# Altium footprint library 6-Connectors-3.PcbLib: 153 footprints (part 8 of 11) (continued)
## TYCO_1-770182-0 [mm] "9 Circuits Vertiacal Mini-Universal MATE-N-LOK Connector"
height 14.25
pads (10):
  round 2.1 hole 1.4: 1(4.14,4.14) 2(0,4.14) 3(-4.14,4.14) 4(4.14,0) 5(0,0) 6(-4.14,0) 7(4.14,-4.14) 8(0,-4.14) 9(-4.14,-4.14)
  round 1 hole 3.2 unplated mask+1.2: 10(8.59,4.14)
Top Overlay:
  lines w0.2: -6.985,-5.41 -9.576,-5.41 -9.576,-2.87 -6.985,-2.87 ; -5.842,-6.985 -5.842,-7.747 -6.985,-7.747 -6.985,-6.985 ; -2.845,-6.985 -2.845,-7.747 -1.702,-7.747 -1.702,-6.985 ; -1.499,6.985 -1.499,8.28 1.499,8.28 1.499,6.985 ; 1.295,-6.985 1.295,-7.747 2.438,-7.747 2.438,-6.985 ; 5.436,-6.985 5.436,-7.747 6.579,-7.747 6.579,-6.985 ; 6.985,3 6.985,-6.985 -6.985,-6.985 ; 6.985,5.3 6.985,6.985 -6.985,6.985 -6.985,-6.985 ; 7.561,2.646 7.561,2.353 ccw(c8.298,4.178) 9.267,2.465 ; 7.561,5.71 7.561,6.004 cw(c8.298,4.178) 9.492,5.743 ; -5.969,-5.969 -5.969,-2.311 -2.311,-2.311 -2.311,-5.969 -5.969,-5.969 ; -5.969,-1.829 -5.969,1.829 -2.311,1.829 -2.311,-1.829 -5.969,-1.829 ; -5.969,2.311 -5.969,5.969 -2.311,5.969 -2.311,2.311 -5.969,2.311 ; -1.829,-5.969 1.829,-5.969 1.829,-3.299 0.841,-2.311 -0.841,-2.311 -1.829,-3.299 -1.829,-5.969 ; -1.829,-1.829 -1.829,1.829 1.829,1.829 1.829,-1.829 -1.829,-1.829 ; -1.829,3.299 -0.841,2.311 0.841,2.311 1.829,3.299 1.829,5.969 -1.829,5.969 -1.829,3.299 ; 2.311,-5.969 2.311,-2.311 5.969,-2.311 5.969,-5.969 2.311,-5.969 ; 2.311,-0.841 3.299,-1.829 5.969,-1.829 5.969,1.829 3.299,1.829 2.311,0.841 2.311,-0.841 ; 2.311,2.311 2.311,5.969 5.969,5.969 5.969,2.311 2.311,2.311
  text "6" at -7.982,-0.505 h1.02
  text "4" at 7.318,-0.605 h1.02
  text "9" at -3.575,-7.882 h1.02
  text "8" at 0.565,-7.882 h1.02
  text "7" at 4.705,-7.882 h1.02
  text "3" at -3.715,7.355 h1.02
  text "1" at 4.64,7.555 h1.02
  text "2" at 0.576,7.261 h1.02
Mechanical 8:
  lines w0.1: -5.14,-4.14 -4.14,-4.14 ; -5.14,0 -4.14,0 ; -5.14,4.14 -4.14,4.14 ; -4.14,-5.14 -4.14,-4.14 ; -4.14,-3.14 -4.14,-4.14 ; -4.14,-1 -4.14,0 ; -4.14,1 -4.14,0 ; -4.14,3.14 -4.14,4.14 ; -4.14,5.14 -4.14,4.14 ; -3.14,-4.14 -4.14,-4.14 ; -3.14,0 -4.14,0 ; -3.14,4.14 -4.14,4.14 ; -1,-4.14 0,-4.14 ; -1,4.14 0,4.14 ; 0,-5.14 0,-4.14 ; 0,-3.14 0,-4.14 ; 0,3.14 0,4.14 ; 0,5.14 0,4.14 ; 1,-4.14 0,-4.14 ; 1,4.14 0,4.14 ; 3.14,-4.14 4.14,-4.14 ; 3.14,0 4.14,0 ; 3.14,4.14 4.14,4.14 ; 4.14,-5.14 4.14,-4.14 ; 4.14,-3.14 4.14,-4.14 ; 4.14,-1 4.14,0 ; 4.14,1 4.14,0 ; 4.14,3.14 4.14,4.14 ; 4.14,5.14 4.14,4.14 ; 5.14,-4.14 4.14,-4.14 ; 5.14,0 4.14,0 ; 5.14,4.14 4.14,4.14 ; 7.59,4.14 8.59,4.14 ; 8.59,3.14 8.59,4.14 ; 8.59,5.14 8.59,4.14 ; 9.59,4.14 8.59,4.14 ; 0,0 -1,0 0,0 ; 0,0 1,0 0,0 ; 0,0 0,1 0,0 ; 0,0 0,-1 0,0
Mechanical 14:
  drawing of 162 lines, arcs and shapes, not listed
  text "6" at -7.982,-0.505 h1.02
  text "4" at 7.318,-0.605 h1.02
  text "9" at -3.575,-7.882 h1.02
  text "8" at 0.565,-7.882 h1.02
  text "7" at 4.705,-7.882 h1.02
  text "3" at -3.715,7.355 h1.02
  text "1" at 4.64,7.555 h1.02
  text "2" at 0.576,7.261 h1.02
3D body "TYCO_1-770182-0.stp": height 14.25, standoff -4.32, extent -9.576,-7.747 9.576,8.28

## TYCO_1-794065-0 [mm] "8 Circuits Double Row Vertiacal Mini-Universal MATE-N-LOK Connector"
height 14.25
pads (9):
  round 2.1 hole 1.4: 1(6.21,2.07) 2(2.07,2.07) 3(-2.07,2.07) 4(-6.21,2.07) 5(6.21,-2.07) 6(2.07,-2.07) 7(-2.07,-2.07) 8(-6.21,-2.07)
  round 1 hole 3.2 unplated mask+1.2: 9(10.655,2.07)
Top Overlay:
  lines w0.2: -9.055,-4.915 9.055,-4.915 9.055,1 ; -9.055,-3.34 -11.645,-3.34 -11.645,-0.8 -9.055,-0.8 ; -7.912,-4.915 -7.912,-5.677 -9.055,-5.677 -9.055,4.915 9.055,4.915 9.055,3.2 ; -4.915,-4.915 -4.915,-5.677 -3.772,-5.677 -3.772,-4.915 ; -1.499,4.915 -1.499,6.21 1.499,6.21 1.499,4.915 ; -0.775,-4.915 -0.775,-5.677 0.368,-5.677 0.368,-4.915 ; 3.365,-4.915 3.365,-5.677 4.508,-5.677 4.508,-4.915 ; 7.505,-4.915 7.505,-5.677 8.648,-5.677 8.648,-4.915 ; 9.69,0.234 9.69,0.527 ; 9.69,0.255 ccw(c10.452,2.07) 11.62,0.486 ; 9.69,3.592 9.69,3.885 cw(c10.452,2.07) 11.62,3.654 ; -7.988,-3.848 -4.432,-3.848 -4.432,-0.292 -7.988,-0.292 -7.988,-3.848 ; -7.988,1.384 -6.896,0.292 -4.432,0.292 -4.432,3.848 -6.896,3.848 -7.988,2.756 -7.988,1.384 ; -3.848,-3.848 -0.292,-3.848 -0.292,-0.292 -3.848,-0.292 -3.848,-3.848 ; -3.848,0.292 -3.848,3.848 -0.292,3.848 -0.292,0.292 -3.848,0.292 ; 0.292,-3.848 0.292,-0.292 3.848,-0.292 3.848,-3.848 0.292,-3.848 ; 0.292,0.292 0.292,3.848 3.848,3.848 3.848,0.292 0.292,0.292 ; 4.432,-3.848 7.988,-3.848 7.988,-0.292 4.432,-0.292 4.432,-3.848 ; 4.432,0.292 6.896,0.292 7.988,1.384 7.988,2.756 6.896,3.848 4.432,3.848 4.432,0.292
  text "1" at 6.765,5.43 h1.02
  text "2" at 3.125,5.28 h1.02
  text "3" at -1.99,5.23 h1.02
  text "4" at -5.655,5.23 h1.02
  text "5" at 6.73,-5.907 h1.02
  text "6" at 2.59,-5.907 h1.02
  text "7" at -1.55,-5.907 h1.02
  text "8" at -5.69,-5.907 h1.02
Mechanical 8:
  lines w0.1: -7.21,-2.07 -6.21,-2.07 ; -7.21,2.07 -6.21,2.07 ; -6.21,-3.07 -6.21,-2.07 ; -6.21,-1.07 -6.21,-2.07 ; -6.21,1.07 -6.21,2.07 ; -6.21,3.07 -6.21,2.07 ; -5.21,-2.07 -6.21,-2.07 ; -5.21,2.07 -6.21,2.07 ; -3.07,-2.07 -2.07,-2.07 ; -3.07,2.07 -2.07,2.07 ; -2.07,-3.07 -2.07,-2.07 ; -2.07,-1.07 -2.07,-2.07 ; -2.07,1.07 -2.07,2.07 ; -2.07,3.07 -2.07,2.07 ; -1.07,-2.07 -2.07,-2.07 ; -1.07,2.07 -2.07,2.07 ; -1,0 0,0 ; 0,-1 0,0 ; 0,1 0,0 ; 1,0 0,0 ; 1.07,-2.07 2.07,-2.07 ; 1.07,2.07 2.07,2.07 ; 2.07,-3.07 2.07,-2.07 ; 2.07,-1.07 2.07,-2.07 ; 2.07,1.07 2.07,2.07 ; 2.07,3.07 2.07,2.07 ; 3.07,-2.07 2.07,-2.07 ; 3.07,2.07 2.07,2.07 ; 5.21,-2.07 6.21,-2.07 ; 5.21,2.07 6.21,2.07 ; 6.21,-3.07 6.21,-2.07 ; 6.21,-1.07 6.21,-2.07 ; 6.21,1.07 6.21,2.07 ; 6.21,3.07 6.21,2.07 ; 7.21,-2.07 6.21,-2.07 ; 7.21,2.07 6.21,2.07 ; 9.655,2.07 10.655,2.07 ; 10.655,1.07 10.655,2.07 ; 10.655,3.07 10.655,2.07 ; 11.655,2.07 10.655,2.07
Mechanical 14:
  drawing of 172 lines, arcs and shapes, not listed
  text "1" at 6.765,5.43 h1.02
  text "2" at 3.125,5.28 h1.02
  text "3" at -1.99,5.23 h1.02
  text "4" at -5.655,5.23 h1.02
  text "5" at 6.73,-5.907 h1.02
  text "6" at 2.59,-5.907 h1.02
  text "7" at -1.55,-5.907 h1.02
  text "8" at -5.69,-5.907 h1.02
3D body "TYCO_1-794065-0.stp": height 14.25, standoff -4.06, extent -11.645,-5.677 11.62,6.21

## TYCO_1-794068-0 [mm] "16 Circuits Double Row Vertiacal Mini-Universal MATE-N-LOK Connector"
height 14.25
pads (18):
  round 2.1 hole 1.4: 1(14.491,1.816) 2(10.351,1.816) 3(6.21,1.816) 4(2.07,1.816) 5(-2.07,1.816) 6(-6.21,1.816) 7(-10.351,1.816) 8(-14.491,1.816) 9(14.491,-2.324) 10(10.351,-2.324) 11(6.21,-2.324) 12(2.07,-2.324) 13(-2.07,-2.324) 14(-6.21,-2.324) 15(-10.351,-2.324) 16(-14.491,-2.324)
  round 1 hole 3.2 unplated mask+1.2: 17(18.941,1.816) 18(-18.941,1.816)
Top Overlay:
  lines w0.2: -19.926,0.251 ccw(c-18.733,1.816) -17.996,-0.009 -17.996,0.284 ; -19.926,3.381 cw(c-18.733,1.816) -17.996,3.642 -17.996,3.348 ; -16.193,-5.169 -16.193,-5.931 -17.336,-5.931 -17.336,-5.169 ; -15.31,-5.169 -17.336,-5.169 ; -13.31,-5.169 17.336,-5.169 17.336,4.661 -17.336,4.661 -17.336,-5.169 ; -13.195,-5.169 -13.195,-5.931 -12.052,-5.931 -12.052,-5.169 ; -9.055,-5.169 -9.055,-5.931 -7.912,-5.931 -7.912,-5.169 ; -4.915,-5.169 -4.915,-5.931 -3.772,-5.931 -3.772,-5.169 ; -1.499,4.661 -1.499,5.956 1.499,5.956 1.499,4.661 ; -0.775,-5.169 -0.775,-5.931 0.368,-5.931 0.368,-5.169 ; 3.366,-5.169 3.366,-5.931 4.509,-5.931 4.509,-5.169 ; 7.506,-5.169 7.506,-5.931 8.649,-5.931 8.649,-5.169 ; 11.646,-5.169 11.646,-5.931 12.789,-5.931 12.789,-5.169 ; 15.786,-5.169 15.786,-5.931 16.929,-5.931 16.929,-5.169 ; 17.996,0.284 17.996,-0.009 ccw(c18.733,1.816) 19.926,0.251 ; 17.996,3.348 17.996,3.642 cw(c18.733,1.816) 19.926,3.381 ; -16.269,-4.102 -12.713,-4.102 -12.713,-1.638 -13.805,-0.546 -15.177,-0.546 -16.269,-1.638 -16.269,-4.102 ; -16.269,0.038 -16.269,3.594 -12.713,3.594 -12.713,0.038 -16.269,0.038 ; -12.129,-4.102 -12.129,-0.546 -8.573,-0.546 -8.573,-4.102 -12.129,-4.102 ; -12.129,0.038 -12.129,3.594 -8.573,3.594 -8.573,0.038 -12.129,0.038 ; -7.988,-4.102 -4.432,-4.102 -4.432,-1.638 -5.525,-0.546 -6.896,-0.546 -7.988,-1.638 -7.988,-4.102 ; -7.988,0.038 -4.432,0.038 -4.432,2.502 -5.525,3.594 -6.896,3.594 -7.988,2.502 -7.988,0.038 ; -3.848,-4.102 -3.848,-0.546 -0.292,-0.546 -0.292,-4.102 -3.848,-4.102 ; -3.848,0.038 -3.848,3.594 -0.292,3.594 -0.292,0.038 -3.848,0.038 ; 0.292,-4.102 0.292,-0.546 3.848,-0.546 3.848,-4.102 0.292,-4.102 ; 0.292,0.038 0.292,3.594 3.848,3.594 3.848,0.038 0.292,0.038 ; 4.432,-3.01 5.525,-4.102 7.988,-4.102 7.988,-0.546 5.525,-0.546 4.432,-1.638 4.432,-3.01 ; 4.432,1.13 5.525,0.038 7.988,0.038 7.988,3.594 5.525,3.594 4.432,2.502 4.432,1.13 ; 8.573,-4.102 8.573,-0.546 12.129,-0.546 12.129,-4.102 8.573,-4.102 ; 8.573,0.038 8.573,3.594 12.129,3.594 12.129,0.038 8.573,0.038 ; 12.713,-4.102 12.713,-0.546 15.177,-0.546 16.269,-1.638 16.269,-3.01 15.177,-4.102 12.713,-4.102 ; 12.713,0.038 12.713,3.594 16.269,3.594 16.269,0.038 12.713,0.038
  text "1" at 14.893,3.906 h1
  text "16" at -13.92,-5.907 h1
  text "9" at 14.96,-4.891 h1
  text "8" at -14.072,3.745 h1
Mechanical 8:
  lines w0.1: -19.941,1.816 -18.941,1.816 ; -18.941,0.816 -18.941,1.816 ; -18.941,2.816 -18.941,1.816 ; -17.941,1.816 -18.941,1.816 ; -15.491,-2.324 -14.491,-2.324 ; -15.491,1.816 -14.491,1.816 ; -14.491,-3.324 -14.491,-2.324 ; -14.491,-1.324 -14.491,-2.324 ; -14.491,0.816 -14.491,1.816 ; -14.491,2.816 -14.491,1.816 ; -13.491,-2.324 -14.491,-2.324 ; -13.491,1.816 -14.491,1.816 ; -11.351,-2.324 -10.351,-2.324 ; -11.351,1.816 -10.351,1.816 ; -10.351,-3.324 -10.351,-2.324 ; -10.351,-1.324 -10.351,-2.324 ; -10.351,0.816 -10.351,1.816 ; -10.351,2.816 -10.351,1.816 ; -9.351,-2.324 -10.351,-2.324 ; -9.351,1.816 -10.351,1.816 ; -7.21,-2.324 -6.21,-2.324 ; -7.21,1.816 -6.21,1.816 ; -6.21,-3.324 -6.21,-2.324 ; -6.21,-1.324 -6.21,-2.324 ; -6.21,0.816 -6.21,1.816 ; -6.21,2.816 -6.21,1.816 ; -5.21,-2.324 -6.21,-2.324 ; -5.21,1.816 -6.21,1.816 ; -3.07,-2.324 -2.07,-2.324 ; -3.07,1.816 -2.07,1.816 ; -2.07,-3.324 -2.07,-2.324 ; -2.07,-1.324 -2.07,-2.324 ; -2.07,0.816 -2.07,1.816 ; -2.07,2.816 -2.07,1.816 ; -1.07,-2.324 -2.07,-2.324 ; -1.07,1.816 -2.07,1.816 ; -1,0 0,0 ; 0,-1 0,0 ; 0,1 0,0 ; 1,0 0,0 ; 1.07,-2.324 2.07,-2.324 ; 1.07,1.816 2.07,1.816 ; 2.07,-3.324 2.07,-2.324 ; 2.07,-1.324 2.07,-2.324 ; 2.07,0.816 2.07,1.816 ; 2.07,2.816 2.07,1.816 ; 3.07,-2.324 2.07,-2.324 ; 3.07,1.816 2.07,1.816 ; 5.21,-2.324 6.21,-2.324 ; 5.21,1.816 6.21,1.816 ; 6.21,-3.324 6.21,-2.324 ; 6.21,-1.324 6.21,-2.324 ; 6.21,0.816 6.21,1.816 ; 6.21,2.816 6.21,1.816 ; 7.21,-2.324 6.21,-2.324 ; 7.21,1.816 6.21,1.816 ; 9.351,-2.324 10.351,-2.324 ; 9.351,1.816 10.351,1.816 ; 10.351,-3.324 10.351,-2.324 ; 10.351,-1.324 10.351,-2.324 ; 10.351,0.816 10.351,1.816 ; 10.351,2.816 10.351,1.816 ; 11.351,-2.324 10.351,-2.324 ; 11.351,1.816 10.351,1.816 ; 13.491,-2.324 14.491,-2.324 ; 13.491,1.816 14.491,1.816 ; 14.491,-3.324 14.491,-2.324 ; 14.491,-1.324 14.491,-2.324 ; 14.491,0.816 14.491,1.816 ; 14.491,2.816 14.491,1.816 ; 15.491,-2.324 14.491,-2.324 ; 15.491,1.816 14.491,1.816 ; 17.941,1.816 18.941,1.816 ; 18.941,0.816 18.941,1.816 ; 18.941,2.816 18.941,1.816 ; 19.941,1.816 18.941,1.816
Mechanical 14:
  lines w0.1: -19.926,0.991 ccw(c-18.961,1.816) -17.996,0.991 ; -19.926,2.642 cw(c-18.961,1.816) -17.996,2.642 ; -17.336,1.054 -17.996,1.054 -17.996,-0.009 cw(c-18.733,1.816) -19.926,0.251 -19.926,3.381 cw(c-18.733,1.816) -17.996,3.642 -17.996,2.578 -17.336,2.578 ; -16.193,-5.169 -16.193,-5.931 -17.336,-5.931 -17.336,-5.169 ; -15.31,-5.169 -17.336,-5.169 ; -13.31,-5.169 17.336,-5.169 17.336,4.661 -17.336,4.661 -17.336,-5.169 ; -13.195,-5.169 -13.195,-5.931 -12.052,-5.931 -12.052,-5.169 ; -9.055,-5.169 -9.055,-5.931 -7.912,-5.931 -7.912,-5.169 ; -4.915,-5.169 -4.915,-5.931 -3.772,-5.931 -3.772,-5.169 ; -1.499,4.661 -1.499,5.956 1.499,5.956 1.499,4.661 ; -0.775,-5.169 -0.775,-5.931 0.368,-5.931 0.368,-5.169 ; 3.366,-5.169 3.366,-5.931 4.509,-5.931 4.509,-5.169 ; 7.506,-5.169 7.506,-5.931 8.649,-5.931 8.649,-5.169 ; 11.646,-5.169 11.646,-5.931 12.789,-5.931 12.789,-5.169 ; 15.786,-5.169 15.786,-5.931 16.929,-5.931 16.929,-5.169 ; 17.336,1.054 17.996,1.054 17.996,-0.009 ccw(c18.733,1.816) 19.926,0.251 19.926,3.381 ccw(c18.733,1.816) 17.996,3.642 17.996,2.578 17.336,2.578 ; 17.996,0.991 ccw(c18.961,1.816) 19.926,0.991 ; 17.996,2.642 cw(c18.961,1.816) 19.926,2.642 ; -16.269,-4.102 -12.713,-4.102 -12.713,-1.638 -13.805,-0.546 -15.177,-0.546 -16.269,-1.638 -16.269,-4.102 ; -16.269,0.038 -16.269,3.594 -12.713,3.594 -12.713,0.038 -16.269,0.038 ; -12.129,-4.102 -12.129,-0.546 -8.573,-0.546 -8.573,-4.102 -12.129,-4.102 ; -12.129,0.038 -12.129,3.594 -8.573,3.594 -8.573,0.038 -12.129,0.038 ; -7.988,-4.102 -7.988,-1.638 -6.896,-0.546 -5.525,-0.546 -4.432,-1.638 -4.432,-4.102 -7.988,-4.102 ; -7.988,0.038 -7.988,2.502 -6.896,3.594 -5.525,3.594 -4.432,2.502 -4.432,0.038 -7.988,0.038 ; -3.848,-4.102 -3.848,-0.546 -0.292,-0.546 -0.292,-4.102 -3.848,-4.102 ; -3.848,0.038 -3.848,3.594 -0.292,3.594 -0.292,0.038 -3.848,0.038 ; 0.292,-4.102 0.292,-0.546 3.848,-0.546 3.848,-4.102 0.292,-4.102 ; 0.292,0.038 0.292,3.594 3.848,3.594 3.848,0.038 0.292,0.038 ; 4.432,-3.01 5.525,-4.102 7.988,-4.102 7.988,-0.546 5.525,-0.546 4.432,-1.638 4.432,-3.01 ; 4.432,1.13 4.432,2.502 5.525,3.594 7.988,3.594 7.988,0.038 5.525,0.038 4.432,1.13 ; 8.573,-4.102 8.573,-0.546 12.129,-0.546 12.129,-4.102 8.573,-4.102 ; 8.573,0.038 8.573,3.594 12.129,3.594 12.129,0.038 8.573,0.038 ; 12.713,-4.102 12.713,-0.546 15.177,-0.546 16.269,-1.638 16.269,-3.01 15.177,-4.102 12.713,-4.102 ; 12.713,0.038 12.713,3.594 16.269,3.594 16.269,0.038 12.713,0.038
  text "1" at 14.893,3.906 h1
  text "16" at -13.92,-5.907 h1
  text "9" at 14.96,-4.891 h1
  text "8" at -14.072,3.745 h1
3D body "TYCO_1-794068-0.stp": height 14.25, standoff -4.06, extent -19.926,-5.931 19.926,5.956

## TYCO_3-794630-4 [mm] "4 Circuits Dual-Row - Vertical Micro MATE-N-LOK Connector"
height 9.24
pads (4):
  round 1.8 hole 1.1: 1(1.5,-1.5) 2(-1.5,-1.5) 3(1.5,1.5) 4(-1.5,1.5)
Top Overlay:
  lines w0.2: -3.86,-1 -3.43,-1 ; -3.86,1 -3.43,1 ; -1.9,-3.43 cw(c-1.9,-3.63) -1.7,-3.63 -1.7,-3.94 -0.45,-3.94 -0.45,-3.63 cw(c-0.25,-3.63) -0.25,-3.43 ; -1.3,3.43 ccw(c-1.3,4.03) -0.7,4.03 -0.7,4.082 ; 0.25,-3.43 cw(c0.25,-3.63) 0.45,-3.63 0.45,-3.94 1.7,-3.94 1.7,-3.63 cw(c1.9,-3.63) 1.9,-3.43 ; 1.3,3.43 cw(c1.3,4.03) 0.7,4.03 0.7,4.082 ; 3.43,-1 3.86,-1 ; 3.43,1 3.86,1 ; -4.55,-1.5 -3.86,-1.5 -3.86,1.5 -4.55,1.5 ; -4.55,-1.5 -5,-0.72 -5,0.72 -4.55,1.5 ; -4.55,-1.5 -4.55,1.5 ; -0.7,4.082 -0.7,4.73 0.7,4.73 0.7,4.082 ; -0.7,4.082 0.7,4.082 ; 4.55,-1.5 3.86,-1.5 3.86,1.5 4.55,1.5 ; 4.55,-1.5 4.55,1.5 ; 4.55,-1.5 5,-0.72 5,0.72 4.55,1.5 ; -3.43,-3.43 -3.43,3.43 3.43,3.43 3.43,-3.43 -3.43,-3.43 ; -2.81,-2.11 -2.81,-0.19 -0.19,-0.19 -0.19,-2.81 -2.11,-2.81 -2.81,-2.11 ; -2.81,0.19 -0.89,0.19 -0.19,0.89 -0.19,2.81 -2.81,2.81 -2.81,0.19 ; 0.19,-2.81 2.11,-2.81 2.81,-2.11 2.81,-0.19 0.19,-0.19 0.19,-2.81 ; 0.19,0.89 0.19,2.81 2.81,2.81 2.81,0.19 0.89,0.19 0.19,0.89
  text "1" at 3.048,-4.245 h1.02
  text "2" at -2.007,-4.445 h1.02
  text "4" at -1.575,3.734 h1.02
  text "3" at 2.743,3.712 h1.02
Mechanical 8:
  lines w0.1: -2.5,-1.5 -1.5,-1.5 ; -2.5,1.5 -1.5,1.5 ; -1.5,-2.5 -1.5,-1.5 ; -1.5,-0.5 -1.5,-1.5 ; -1.5,0.5 -1.5,1.5 ; -1.5,2.5 -1.5,1.5 ; -1,0 0,0 ; -0.5,-1.5 -1.5,-1.5 ; -0.5,1.5 -1.5,1.5 ; 0,-1 0,0 ; 0,1 0,0 ; 0.5,-1.5 1.5,-1.5 ; 0.5,1.5 1.5,1.5 ; 1,0 0,0 ; 1.5,-2.5 1.5,-1.5 ; 1.5,-0.5 1.5,-1.5 ; 1.5,0.5 1.5,1.5 ; 1.5,2.5 1.5,1.5 ; 2.5,-1.5 1.5,-1.5 ; 2.5,1.5 1.5,1.5
Mechanical 14:
  lines w0.1: -3.86,-1 -3.43,-1 ; -3.86,1 -3.43,1 ; -1.9,-3.43 cw(c-1.9,-3.63) -1.7,-3.63 -1.7,-3.94 -0.45,-3.94 -0.45,-3.63 cw(c-0.25,-3.63) -0.25,-3.43 ; -1.3,3.43 ccw(c-1.3,4.03) -0.7,4.03 -0.7,4.082 ; 0.25,-3.43 cw(c0.25,-3.63) 0.45,-3.63 0.45,-3.94 1.7,-3.94 1.7,-3.63 cw(c1.9,-3.63) 1.9,-3.43 ; 1.3,3.43 cw(c1.3,4.03) 0.7,4.03 0.7,4.082 ; 3.43,-1 3.86,-1 ; 3.43,1 3.86,1 ; -4.55,-1.5 -3.86,-1.5 -3.86,1.5 -4.55,1.5 ; -4.55,-1.5 -5,-0.72 -5,0.72 -4.55,1.5 ; -4.55,-1.5 -4.55,1.5 ; -0.7,4.082 -0.7,4.73 0.7,4.73 0.7,4.082 ; -0.7,4.082 0.7,4.082 ; 4.55,-1.5 3.86,-1.5 3.86,1.5 4.55,1.5 ; 4.55,-1.5 4.55,1.5 ; 4.55,-1.5 5,-0.72 5,0.72 4.55,1.5 ; -3.43,-3.43 -3.43,3.43 3.43,3.43 3.43,-3.43 -3.43,-3.43 ; -2.81,-2.11 -2.81,-0.19 -0.19,-0.19 -0.19,-2.81 -2.11,-2.81 -2.81,-2.11 ; -2.81,0.19 -0.89,0.19 -0.19,0.89 -0.19,2.81 -2.81,2.81 -2.81,0.19 ; 0.19,-2.81 2.11,-2.81 2.81,-2.11 2.81,-0.19 0.19,-0.19 0.19,-2.81 ; 0.19,0.89 0.19,2.81 2.81,2.81 2.81,0.19 0.89,0.19 0.19,0.89
  text "1" at 3.048,-4.245 h1.02
  text "2" at -2.007,-4.445 h1.02
  text "4" at -1.575,3.734 h1.02
  text "3" at 2.743,3.712 h1.02
3D body "TYCO_3-794630-4.stp": height 9.24, standoff -3.18, extent -5,-3.94 5,4.73

## TYCO_3-794630-8 [mm] "8 Circuits Dual-Row - Vertical Micro MATE-N-LOK Connector"
height 9.24
pads (8):
  round 1.8 hole 1.1: 1(4.5,-1.5) 2(1.5,-1.5) 3(-1.5,-1.5) 4(-4.5,-1.5) 5(4.5,1.5) 6(1.5,1.5) 7(-1.5,1.5) 8(-4.5,1.5)
Top Overlay:
  lines w0.2: -6.86,-1 -6.43,-1 ; -6.86,1 -6.43,1 ; -4.25,-3.43 cw(c-4.25,-3.63) -4.05,-3.63 -4.05,-3.94 -2.8,-3.94 -2.8,-3.63 cw(c-2.6,-3.63) -2.6,-3.43 ; -1.3,3.43 ccw(c-1.3,4.03) -0.7,4.03 -0.7,4.082 ; 1.3,3.43 cw(c1.3,4.03) 0.7,4.03 0.7,4.082 ; 2.6,-3.43 cw(c2.6,-3.63) 2.8,-3.63 2.8,-3.94 4.05,-3.94 4.05,-3.63 cw(c4.25,-3.63) 4.25,-3.43 ; 6.43,-1 6.86,-1 ; 6.43,1 6.86,1 ; -7.55,-1.5 -7.55,1.5 ; -7.55,-1.5 -8,-0.72 -8,0.72 -7.55,1.5 ; -7.55,-1.5 -6.86,-1.5 -6.86,1.5 -7.55,1.5 ; -0.7,4.082 0.7,4.082 ; -0.7,4.082 -0.7,4.73 0.7,4.73 0.7,4.082 ; 7.55,-1.5 8,-0.72 8,0.72 7.55,1.5 ; 7.55,-1.5 7.55,1.5 ; 7.55,-1.5 6.86,-1.5 6.86,1.5 7.55,1.5 ; -6.43,-3.43 6.43,-3.43 6.43,3.43 -6.43,3.43 -6.43,-3.43 ; -5.81,-2.81 -5.81,-0.19 -3.19,-0.19 -3.19,-2.11 -3.89,-2.81 -5.81,-2.81 ; -5.81,0.19 -5.81,2.81 -3.19,2.81 -3.19,0.19 -5.81,0.19 ; -2.81,-2.11 -2.11,-2.81 -0.19,-2.81 -0.19,-0.19 -2.81,-0.19 -2.81,-2.11 ; -2.81,0.89 -2.11,0.19 -0.19,0.19 -0.19,2.81 -2.81,2.81 -2.81,0.89 ; 0.19,-2.81 0.19,-0.19 2.81,-0.19 2.81,-2.11 2.11,-2.81 0.19,-2.81 ; 0.19,0.19 0.19,2.81 2.81,2.81 2.81,0.89 2.11,0.19 0.19,0.19 ; 3.19,-2.11 3.89,-2.81 5.81,-2.81 5.81,-0.19 3.19,-0.19 3.19,-2.11 ; 3.19,0.89 3.89,0.19 5.81,0.19 5.81,2.81 3.19,2.81 3.19,0.89
  text "3" at -0.889,-4.445 h1.02
  text "2" at 2.032,-4.445 h1.02
  text "7" at -1.448,3.685 h1.02
  text "6" at 2.362,3.685 h1.02
  text "5" at 4.902,3.739 h1.02
  text "8" at -4.064,3.71 h1.02
  text "4" at -4.445,-4.445 h1.02
  text "1" at 5.588,-4.245 h1.02
Mechanical 8:
  lines w0.1: -5.5,-1.5 -4.5,-1.5 ; -5.5,1.5 -4.5,1.5 ; -4.5,-2.5 -4.5,-1.5 ; -4.5,-0.5 -4.5,-1.5 ; -4.5,0.5 -4.5,1.5 ; -4.5,2.5 -4.5,1.5 ; -3.5,-1.5 -4.5,-1.5 ; -3.5,1.5 -4.5,1.5 ; -2.5,-1.5 -1.5,-1.5 ; -2.5,1.5 -1.5,1.5 ; -1.5,-2.5 -1.5,-1.5 ; -1.5,-0.5 -1.5,-1.5 ; -1.5,0.5 -1.5,1.5 ; -1.5,2.5 -1.5,1.5 ; -1,0 0,0 ; -0.5,-1.5 -1.5,-1.5 ; -0.5,1.5 -1.5,1.5 ; 0,-1 0,0 ; 0,1 0,0 ; 0.5,-1.5 1.5,-1.5 ; 0.5,1.5 1.5,1.5 ; 1,0 0,0 ; 1.5,-2.5 1.5,-1.5 ; 1.5,-0.5 1.5,-1.5 ; 1.5,0.5 1.5,1.5 ; 1.5,2.5 1.5,1.5 ; 2.5,-1.5 1.5,-1.5 ; 2.5,1.5 1.5,1.5 ; 3.5,-1.5 4.5,-1.5 ; 3.5,1.5 4.5,1.5 ; 4.5,-2.5 4.5,-1.5 ; 4.5,-0.5 4.5,-1.5 ; 4.5,0.5 4.5,1.5 ; 4.5,2.5 4.5,1.5 ; 5.5,-1.5 4.5,-1.5 ; 5.5,1.5 4.5,1.5
Mechanical 14:
  lines w0.1: -6.86,-1 -6.43,-1 ; -6.86,1 -6.43,1 ; -4.25,-3.43 cw(c-4.25,-3.63) -4.05,-3.63 -4.05,-3.94 -2.8,-3.94 -2.8,-3.63 cw(c-2.6,-3.63) -2.6,-3.43 ; -1.3,3.43 ccw(c-1.3,4.03) -0.7,4.03 -0.7,4.082 ; 1.3,3.43 cw(c1.3,4.03) 0.7,4.03 0.7,4.082 ; 2.6,-3.43 cw(c2.6,-3.63) 2.8,-3.63 2.8,-3.94 4.05,-3.94 4.05,-3.63 cw(c4.25,-3.63) 4.25,-3.43 ; 6.43,-1 6.86,-1 ; 6.43,1 6.86,1 ; -7.55,-1.5 -7.55,1.5 ; -7.55,-1.5 -8,-0.72 -8,0.72 -7.55,1.5 ; -7.55,-1.5 -6.86,-1.5 -6.86,1.5 -7.55,1.5 ; -0.7,4.082 0.7,4.082 ; -0.7,4.082 -0.7,4.73 0.7,4.73 0.7,4.082 ; 7.55,-1.5 8,-0.72 8,0.72 7.55,1.5 ; 7.55,-1.5 7.55,1.5 ; 7.55,-1.5 6.86,-1.5 6.86,1.5 7.55,1.5 ; -6.43,-3.43 6.43,-3.43 6.43,3.43 -6.43,3.43 -6.43,-3.43 ; -5.81,-2.81 -5.81,-0.19 -3.19,-0.19 -3.19,-2.11 -3.89,-2.81 -5.81,-2.81 ; -5.81,0.19 -5.81,2.81 -3.19,2.81 -3.19,0.19 -5.81,0.19 ; -2.81,-2.11 -2.11,-2.81 -0.19,-2.81 -0.19,-0.19 -2.81,-0.19 -2.81,-2.11 ; -2.81,0.89 -2.11,0.19 -0.19,0.19 -0.19,2.81 -2.81,2.81 -2.81,0.89 ; 0.19,-2.81 0.19,-0.19 2.81,-0.19 2.81,-2.11 2.11,-2.81 0.19,-2.81 ; 0.19,0.19 0.19,2.81 2.81,2.81 2.81,0.89 2.11,0.19 0.19,0.19 ; 3.19,-2.11 3.89,-2.81 5.81,-2.81 5.81,-0.19 3.19,-0.19 3.19,-2.11 ; 3.19,0.89 3.89,0.19 5.81,0.19 5.81,2.81 3.19,2.81 3.19,0.89
  text "3" at -0.889,-4.445 h1.02
  text "2" at 2.032,-4.445 h1.02
  text "7" at -1.448,3.685 h1.02
  text "6" at 2.362,3.685 h1.02
  text "5" at 4.902,3.739 h1.02
  text "8" at -4.064,3.71 h1.02
  text "4" at -4.445,-4.445 h1.02
  text "1" at 5.588,-4.245 h1.02
3D body "TYCO_3-794630-8.stp": height 9.24, standoff -3.18, extent -8,-3.94 8,4.73

## TYCO_3-794631-4 [mm] "4 Circuits Dual-Row - Vertical Micro MATE-N-LOK Connector - Gold Contact Plating"
height 9.24
pads (4):
  round 1.8 hole 1.1: 1(1.5,-1.5) 2(-1.5,-1.5) 3(1.5,1.5) 4(-1.5,1.5)
Top Overlay:
  lines w0.2: -3.86,-1 -3.43,-1 ; -3.86,1 -3.43,1 ; -1.9,-3.43 cw(c-1.9,-3.63) -1.7,-3.63 -1.7,-3.94 -0.45,-3.94 -0.45,-3.63 cw(c-0.25,-3.63) -0.25,-3.43 ; -1.3,3.43 ccw(c-1.3,4.03) -0.7,4.03 -0.7,4.082 ; 0.25,-3.43 cw(c0.25,-3.63) 0.45,-3.63 0.45,-3.94 1.7,-3.94 1.7,-3.63 cw(c1.9,-3.63) 1.9,-3.43 ; 1.3,3.43 cw(c1.3,4.03) 0.7,4.03 0.7,4.082 ; 3.43,-1 3.86,-1 ; 3.43,1 3.86,1 ; -4.55,-1.5 -4.55,1.5 ; -4.55,-1.5 -5,-0.72 -5,0.72 -4.55,1.5 ; -4.55,-1.5 -3.86,-1.5 -3.86,1.5 -4.55,1.5 ; -0.7,4.082 0.7,4.082 ; -0.7,4.082 -0.7,4.73 0.7,4.73 0.7,4.082 ; 4.55,-1.5 5,-0.72 5,0.72 4.55,1.5 ; 4.55,-1.5 4.55,1.5 ; 4.55,-1.5 3.86,-1.5 3.86,1.5 4.55,1.5 ; -3.43,-3.43 3.43,-3.43 3.43,3.43 -3.43,3.43 -3.43,-3.43 ; -2.81,-2.11 -2.11,-2.81 -0.19,-2.81 -0.19,-0.19 -2.81,-0.19 -2.81,-2.11 ; -2.81,0.19 -2.81,2.81 -0.19,2.81 -0.19,0.89 -0.89,0.19 -2.81,0.19 ; 0.19,-2.81 0.19,-0.19 2.81,-0.19 2.81,-2.11 2.11,-2.81 0.19,-2.81 ; 0.19,0.89 0.89,0.19 2.81,0.19 2.81,2.81 0.19,2.81 0.19,0.89
  text "3" at 2.743,3.712 h1.02
  text "4" at -1.575,3.734 h1.02
  text "2" at -2.007,-4.445 h1.02
  text "1" at 3.048,-4.245 h1.02
Mechanical 8:
  lines w0.1: -2.5,-1.5 -1.5,-1.5 ; -2.5,1.5 -1.5,1.5 ; -1.5,-2.5 -1.5,-1.5 ; -1.5,-0.5 -1.5,-1.5 ; -1.5,0.5 -1.5,1.5 ; -1.5,2.5 -1.5,1.5 ; -1,0 0,0 ; -0.5,-1.5 -1.5,-1.5 ; -0.5,1.5 -1.5,1.5 ; 0,-1 0,0 ; 0,1 0,0 ; 0.5,-1.5 1.5,-1.5 ; 0.5,1.5 1.5,1.5 ; 1,0 0,0 ; 1.5,-2.5 1.5,-1.5 ; 1.5,-0.5 1.5,-1.5 ; 1.5,0.5 1.5,1.5 ; 1.5,2.5 1.5,1.5 ; 2.5,-1.5 1.5,-1.5 ; 2.5,1.5 1.5,1.5
Mechanical 14:
  lines w0.1: -3.86,-1 -3.43,-1 ; -3.86,1 -3.43,1 ; -1.9,-3.43 cw(c-1.9,-3.63) -1.7,-3.63 -1.7,-3.94 -0.45,-3.94 -0.45,-3.63 cw(c-0.25,-3.63) -0.25,-3.43 ; -1.3,3.43 ccw(c-1.3,4.03) -0.7,4.03 -0.7,4.082 ; 0.25,-3.43 cw(c0.25,-3.63) 0.45,-3.63 0.45,-3.94 1.7,-3.94 1.7,-3.63 cw(c1.9,-3.63) 1.9,-3.43 ; 1.3,3.43 cw(c1.3,4.03) 0.7,4.03 0.7,4.082 ; 3.43,-1 3.86,-1 ; 3.43,1 3.86,1 ; -4.55,-1.5 -4.55,1.5 ; -4.55,-1.5 -5,-0.72 -5,0.72 -4.55,1.5 ; -4.55,-1.5 -3.86,-1.5 -3.86,1.5 -4.55,1.5 ; -0.7,4.082 0.7,4.082 ; -0.7,4.082 -0.7,4.73 0.7,4.73 0.7,4.082 ; 4.55,-1.5 5,-0.72 5,0.72 4.55,1.5 ; 4.55,-1.5 4.55,1.5 ; 4.55,-1.5 3.86,-1.5 3.86,1.5 4.55,1.5 ; -3.43,-3.43 3.43,-3.43 3.43,3.43 -3.43,3.43 -3.43,-3.43 ; -2.81,-2.11 -2.11,-2.81 -0.19,-2.81 -0.19,-0.19 -2.81,-0.19 -2.81,-2.11 ; -2.81,0.19 -2.81,2.81 -0.19,2.81 -0.19,0.89 -0.89,0.19 -2.81,0.19 ; 0.19,-2.81 0.19,-0.19 2.81,-0.19 2.81,-2.11 2.11,-2.81 0.19,-2.81 ; 0.19,0.89 0.89,0.19 2.81,0.19 2.81,2.81 0.19,2.81 0.19,0.89
  text "3" at 2.743,3.712 h1.02
  text "4" at -1.575,3.734 h1.02
  text "2" at -2.007,-4.445 h1.02
  text "1" at 3.048,-4.245 h1.02
3D body "TYCO_3-794631-4.stp": height 9.24, standoff -3.18, extent -5,-3.94 5,4.73

## TYCO_350209-1 [mm] "2 Circuits In-Line - 200\" Centerline, Commercial MATE-N-LOK Header"
height 10.29
pads (2):
  round 2.5 hole 1.8: 1(2.54,0) 2(-2.54,0)
Top Overlay:
  circle w0.2: c-2.54,0 r1.587
  circle w0.2: c2.54,0 r1.587
  lines w0.2: -6.541,-1.651 -7.62,-1.651 -7.62,1.651 -6.541,1.651 ; -5.683,-2.921 -6.541,-2.921 ccw(c-5.271,-2.921) -5.271,-4.191 -5.27,-3.143 ; -5.271,2.127 -5.271,4.191 ; -4.667,2.921 -6.541,2.921 ; -3.391,-3.143 -3.391,-2.813 -1.93,-2.813 -1.93,-3.143 ; -3.391,3.143 -3.391,2.813 -1.93,2.813 -1.93,3.143 ; -1.568,-4.191 -1.568,-5.461 -0.406,-5.461 -0.406,-4.191 ; 1.689,-3.143 1.689,-2.813 3.15,-2.813 3.15,-3.143 ; 1.689,3.143 1.689,2.813 3.15,2.813 3.15,3.143 ; 3.404,-4.191 3.404,-5.461 4.674,-5.461 4.674,-4.191 ; 4.667,2.921 6.541,2.921 ; 5.27,-3.143 5.271,-4.191 ; 5.271,2.127 5.271,4.191 ; 5.683,-2.921 6.541,-2.921 ; 6.541,-1.651 7.62,-1.651 7.62,1.651 6.541,1.651 ; -6.541,2.921 cw(c-5.271,2.921) -5.271,4.191 ; -6.541,2.921 -6.541,-5.461 -5.378,-5.461 -5.378,-4.191 5.271,-4.191 ; -5.271,4.191 5.271,4.191 ; 5.271,-4.191 ccw(c5.271,-2.921) 6.541,-2.921 ; 5.271,4.191 cw(c5.271,2.921) 6.541,2.921 ; 6.541,-2.921 6.541,2.921 ; -5.683,-3.143 -5.683,2.127 -4.667,2.127 -4.667,3.143 4.667,3.143 4.667,2.127 5.683,2.127 5.683,-3.143 -5.683,-3.143
  text "2" at -1.95,-5.3 h1.02
  text "1" at 3.025,-5.125 h1.02
Mechanical 8:
  lines w0.1: -1,0 0,0 ; 0,-1 0,0 ; 0,1 0,0 ; 1,0 0,0
Mechanical 14:
  circle w0.1: c2.54,0 r1.048
  circle w0.1: c-2.54,0 r1.048
  circle w0.1: c-2.54,0 r1.587
  circle w0.1: c2.54,0 r1.587
  lines w0.1: -6.541,-1.651 -7.62,-1.651 -7.62,1.651 -6.541,1.651 ; -5.683,-2.921 -6.541,-2.921 ccw(c-5.271,-2.921) -5.271,-4.191 -5.27,-3.143 ; -5.271,2.127 -5.271,4.191 ; -4.667,2.921 -6.541,2.921 ; -3.391,-3.143 -3.391,-2.813 -1.93,-2.813 -1.93,-3.143 ; -3.391,3.143 -3.391,2.813 -1.93,2.813 -1.93,3.143 ; -1.568,-4.191 -1.568,-5.461 -0.406,-5.461 -0.406,-4.191 ; 1.689,-3.143 1.689,-2.813 3.15,-2.813 3.15,-3.143 ; 1.689,3.143 1.689,2.813 3.15,2.813 3.15,3.143 ; 3.404,-4.191 3.404,-5.461 4.674,-5.461 4.674,-4.191 ; 4.667,2.921 6.541,2.921 ; 5.27,-3.143 5.271,-4.191 ; 5.271,2.127 5.271,4.191 ; 5.683,-2.921 6.541,-2.921 ; 6.541,-1.651 7.62,-1.651 7.62,1.651 6.541,1.651 ; -6.541,2.921 cw(c-5.271,2.921) -5.271,4.191 ; -6.541,2.921 -6.541,-5.461 -5.378,-5.461 -5.378,-4.191 5.271,-4.191 ; -5.271,4.191 5.271,4.191 ; 5.271,-4.191 ccw(c5.271,-2.921) 6.541,-2.921 ; 5.271,4.191 cw(c5.271,2.921) 6.541,2.921 ; 6.541,-2.921 6.541,2.921 ; -5.683,-3.143 -5.683,2.127 -4.667,2.127 -4.667,3.143 4.667,3.143 4.667,2.127 5.683,2.127 5.683,-3.143 -5.683,-3.143
  text "2" at -1.95,-5.3 h1.02
  text "1" at 3.025,-5.125 h1.02
3D body "TYCO_350209-1.stp": height 10.29, standoff -3.43, extent -7.62,-5.461 7.62,4.191